# Altium footprint library SOM-PX30-BASEBOARD.PcbLib: 17 footprints (part 2 of 2)
Each footprint in its own frame and in the unit in brackets; x right, y up, seen from the top. Pads: shape width x height; smd on the part's side, far side on the other; paste and mask are expansions set on the pad; w line width, h text height; cw(c..) or ccw(c..) is an arc to the next point about the centre after c.
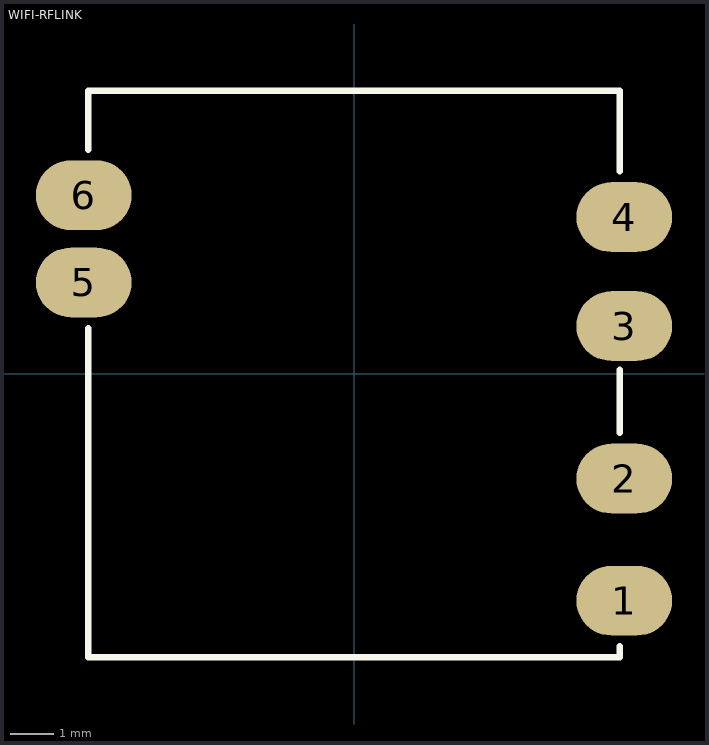
[diagram p1: the footprint, top view; thin cyan lines are the x and y axes]

## WIFI-RFLINK [mm] "WIFI-RFLINK"
pads (6):
  oval 2.2x1.6 smd: 1(6.2,-5.2) 2(6.2,-2.4) 3(6.2,1.1) 4(6.2,3.6) 5(-6.2,2.1) 6(-6.2,4.1)
Top Overlay:
  lines w0.15: -6.1,1.05 -6.1,-6.5 6.1,-6.5 6.1,-6.25 ; -6.1,5.15 -6.1,6.5 6.1,6.5 6.1,4.65 ; 6.1,-1.35 6.1,0.1
Mechanical 7:
  text "1" at 6.2,-4.946 h0.64
  text "5" at -6.2,2.354 h0.64
  text "2" at 6.2,-2.146 h0.64
  text "3" at 6.2,1.354 h0.64
  text "6" at -6.2,4.354 h0.64
  text "4" at 6.2,3.854 h0.64